# Altium footprint library LukaLIBRARY.PcbLib: 784 footprints (part 13 of 49)
Each footprint in its own frame and in the unit in brackets; x right, y up, seen from the top. Pads: shape width x height; smd on the part's side, far side on the other; paste and mask are expansions set on the pad; w line width, h text height; cw(c..) or ccw(c..) is an arc to the next point about the centre after c.
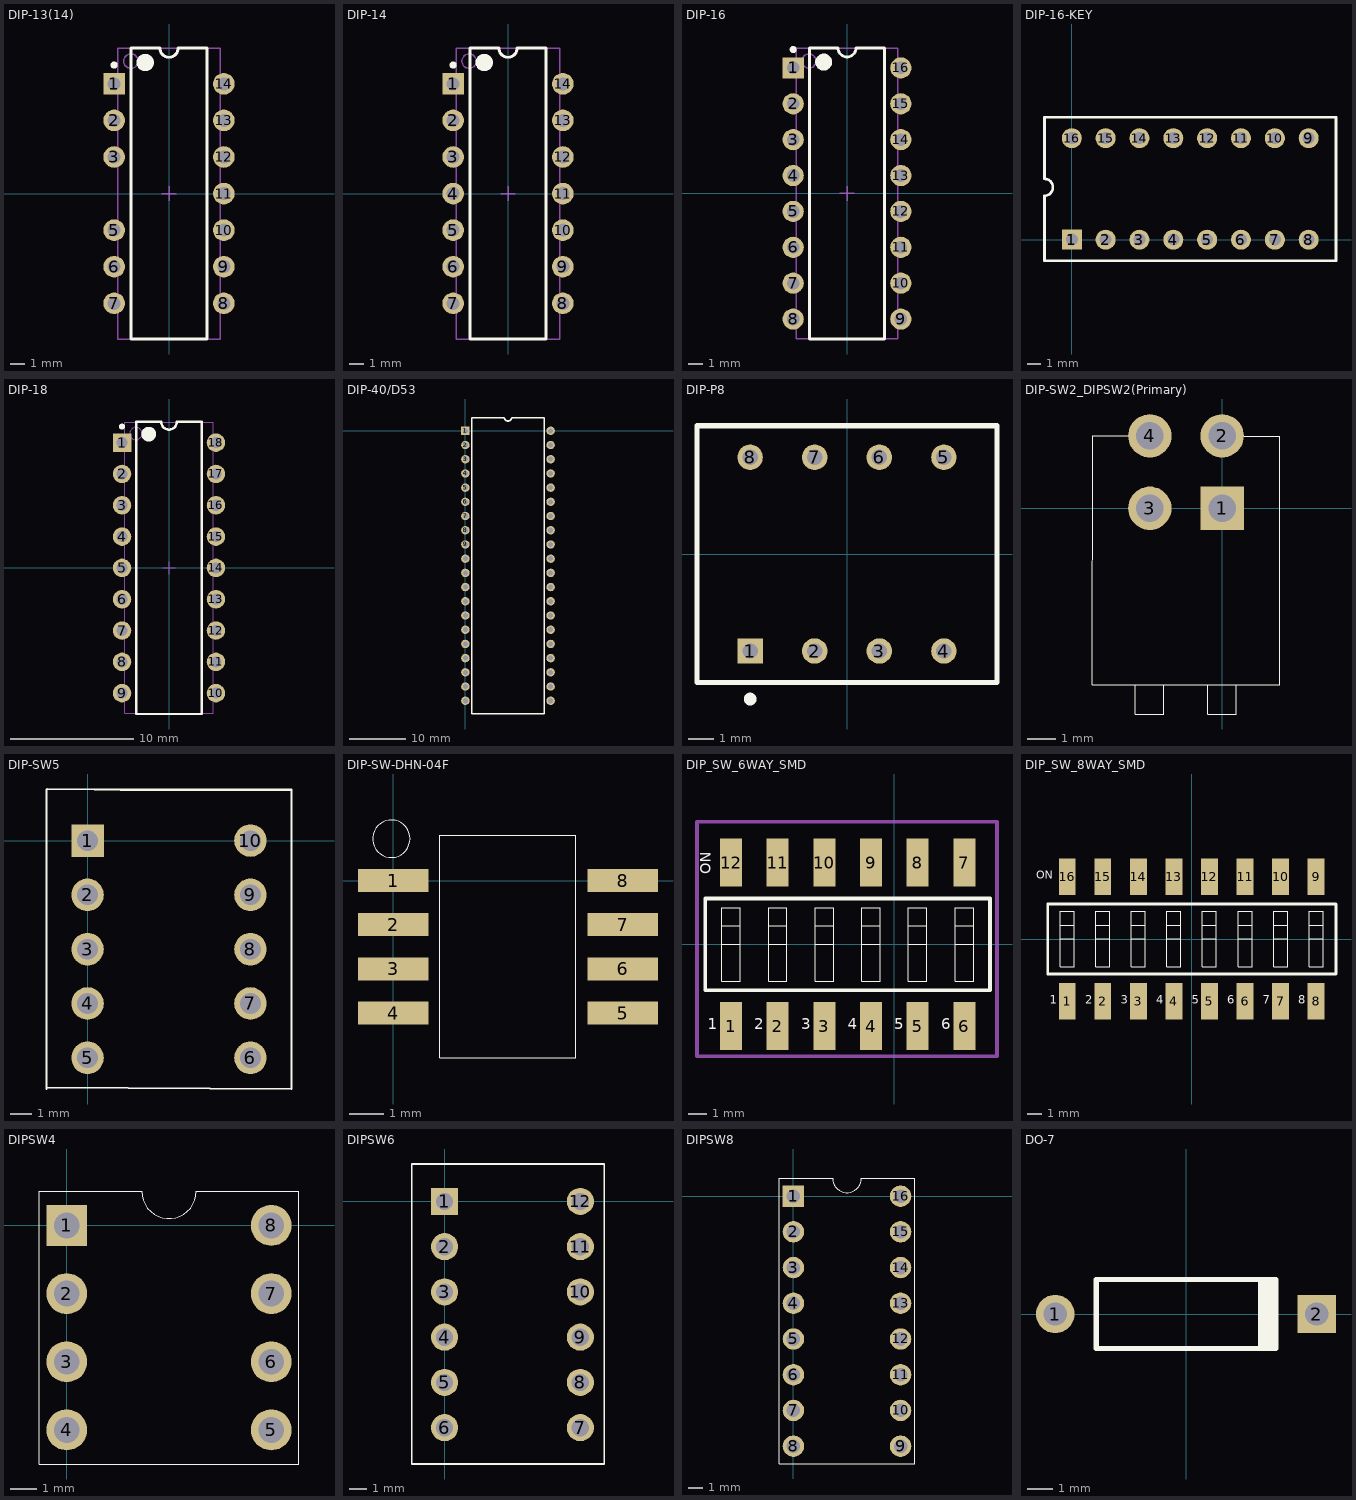
[diagram p12: the footprints below, top view; thin cyan lines are the x and y axes]

## DIP-13(14) [mm] "DIP; 14 Leads (1 Absent); Row Spacing 7.62 mm; Pitch 2.54 mm"
height 5.33
pads (13):
  rect 1.5x1.5 hole 0.9: 1(-3.81,7.62)
  round 1.5 hole 0.9: 2(-3.81,5.08) 3(-3.81,2.54) 5(-3.81,-2.54) 6(-3.81,-5.08) 7(-3.81,-7.62) 8(3.81,-7.62) 9(3.81,-5.08) 10(3.81,-2.54) 11(3.81,0) 12(3.81,2.54) 13(3.81,5.08) 14(3.81,7.62)
Top Overlay:
  circle w0.25: c-3.81,8.92 r0.125
  circle w0.6: c-1.65,9.1 r0.3
  lines w0.2: -2.65,-10.1 -2.65,10.1 -0.635,10.1 ccw(c0,10.1) 0.635,10.1 2.65,10.1 2.65,-10.1 -2.65,-10.1
Mechanical 13:
  circle w0.1: c-2.65,9.2 r0.5
  lines w0.1: -3.55,-10.1 -3.55,10.1 3.55,10.1 3.55,-10.1 -3.55,-10.1
Mechanical 15:
  lines w0.1: -0.5,0 0.5,0 ; 0,-0.5 0,0.5
3D body: height 5.33, standoff 0, extent -3.55,-10.1 3.55,10.1

## DIP-14 [mm] "DIP; 14 Leads; Row Spacing 7.62 mm; Pitch 2.54 mm"
height 5.08
pads (14):
  rect 1.5x1.5 hole 0.9: 1(-3.81,7.62)
  round 1.5 hole 0.9: 2(-3.81,5.08) 3(-3.81,2.54) 4(-3.81,0) 5(-3.81,-2.54) 6(-3.81,-5.08) 7(-3.81,-7.62) 8(3.81,-7.62) 9(3.81,-5.08) 10(3.81,-2.54) 11(3.81,0) 12(3.81,2.54) 13(3.81,5.08) 14(3.81,7.62)
Top Overlay:
  circle w0.6: c-1.65,9.1 r0.3
  circle w0.25: c-3.81,8.92 r0.125
  lines w0.2: -2.65,-10.1 2.65,-10.1 2.65,10.1 0.635,10.1 cw(c0,10.1) -0.635,10.1 -2.65,10.1 -2.65,-10.1
Mechanical 13:
  circle w0.1: c-2.7,9.2 r0.5
  lines w0.1: -3.6,-10.1 3.6,-10.1 3.6,10.1 -3.6,10.1 -3.6,-10.1
Mechanical 15:
  lines w0.1: -0.5,0 0.5,0 ; 0,-0.5 0,0.5
3D body: height 5.08, standoff 0, extent -3.6,-10.1 3.6,10.1

## DIP-16 [mm] "DIP; 16 Leads; Row Spacing 7.62 mm; Pitch 2.54 mm"
height 5.08
pads (16):
  rect 1.5x1.5 hole 0.9: 1(-3.81,8.89)
  round 1.5 hole 0.9: 2(-3.81,6.35) 3(-3.81,3.81) 4(-3.81,1.27) 5(-3.81,-1.27) 6(-3.81,-3.81) 7(-3.81,-6.35) 8(-3.81,-8.89) 9(3.81,-8.89) 10(3.81,-6.35) 11(3.81,-3.81) 12(3.81,-1.27) 13(3.81,1.27) 14(3.81,3.81) 15(3.81,6.35) 16(3.81,8.89)
Top Overlay:
  circle w0.25: c-3.81,10.19 r0.125
  circle w0.6: c-1.65,9.3 r0.3
  lines w0.2: -2.65,-10.3 -2.65,10.3 -0.635,10.3 ccw(c0,10.3) 0.635,10.3 2.65,10.3 2.65,-10.3 -2.65,-10.3
Mechanical 13:
  circle w0.1: c-2.7,9.375 r0.5
  lines w0.1: -3.6,-10.275 -3.6,10.275 3.6,10.275 3.6,-10.275 -3.6,-10.275
Mechanical 15:
  lines w0.1: -0.5,0 0.5,0 ; 0,-0.5 0,0.5
3D body: height 5.08, standoff 0, extent -3.6,-10.275 3.6,10.275

## DIP-16-KEY [mm] "DIP; 16 Leads; Row Spacing 7.62 mm; Pitch 2.54 mm"
pads (16):
  rect 1.5x1.5 hole 0.9: 1(0,0)
  round 1.5 hole 0.9: 2(2.54,0) 3(5.08,0) 4(7.62,0) 5(10.16,0) 6(12.7,0) 7(15.24,0) 8(17.78,0) 9(17.78,7.62) 10(15.24,7.62) 11(12.7,7.62) 12(10.16,7.62) 13(7.62,7.62) 14(5.08,7.62) 15(2.54,7.62) 16(0,7.62)
Top Overlay:
  lines w0.2: -2.05,4.57 cw(c-2.05,3.935) -2.05,3.3 -2.05,-1.59 19.83,-1.59 19.83,9.2 -2.05,9.2 -2.05,4.6

## DIP-18 [mm] "DIP; 18 Leads; Row Spacing 7.62 mm; Pitch 2.54 mm"
height 5.08
pads (18):
  rect 1.5x1.5 hole 0.9: 1(-3.81,10.16)
  round 1.5 hole 0.9: 2(-3.81,7.62) 3(-3.81,5.08) 4(-3.81,2.54) 5(-3.81,0) 6(-3.81,-2.54) 7(-3.81,-5.08) 8(-3.81,-7.62) 9(-3.81,-10.16) 10(3.81,-10.16) 11(3.81,-7.62) 12(3.81,-5.08) 13(3.81,-2.54) 14(3.81,0) 15(3.81,2.54) 16(3.81,5.08) 17(3.81,7.62) 18(3.81,10.16)
Top Overlay:
  circle w0.6: c-1.65,10.85 r0.3
  circle w0.25: c-3.81,11.46 r0.125
  lines w0.2: -2.65,-11.85 2.65,-11.85 2.65,11.85 0.635,11.85 cw(c0,11.85) -0.635,11.85 -2.65,11.85 -2.65,-11.85
Mechanical 13:
  circle w0.1: c-2.7,10.9 r0.5
  lines w0.1: -3.6,-11.8 3.6,-11.8 3.6,11.8 -3.6,11.8 -3.6,-11.8
Mechanical 15:
  lines w0.1: -0.5,0 0.5,0 ; 0,-0.5 0,0.5
3D body: height 5.08, standoff 0, extent -3.6,-11.8 3.6,11.8

## DIP-40/D53 [mm]
pads (40):
  rect 1.5x1.5 hole 0.9: 1(0,0)
  round 1.5 hole 0.9: 2(0,-2.54) 3(0,-5.08) 4(0,-7.62) 5(0,-10.16) 6(0,-12.7) 7(0,-15.24) 8(0,-17.78) 9(0,-20.32) 10(0,-22.86) 11(0,-25.4) 12(0,-27.94) 13(0,-30.48) 14(0,-33.02) 15(0,-35.56) 16(0,-38.1) 17(0,-40.64) 18(0,-43.18) 19(0,-45.72) 20(0,-48.26) 21(15.24,-48.26) 22(15.24,-45.72) 23(15.24,-43.18) 24(15.24,-40.64) 25(15.24,-38.1) 26(15.24,-35.56) 27(15.24,-33.02) 28(15.24,-30.48) 29(15.24,-27.94) 30(15.24,-25.4) 31(15.24,-22.86) 32(15.24,-20.32) 33(15.24,-17.78) 34(15.24,-15.24) 35(15.24,-12.7) 36(15.24,-10.16) 37(15.24,-7.62) 38(15.24,-5.08) 39(15.24,-2.54) 40(15.24,0)
Top Overlay:
  lines w0.25: 1.17,-50.63 14.07,-50.63 14.07,2.37 8.255,2.37 cw(c7.62,2.37) 6.985,2.37 1.17,2.37 1.17,-50.63

## DIP-P8 [mm] "Dual-Pole Dual-Throw Relay; 8 Leads"
pads (8):
  rect 1x1 hole 0.6: 1(-3.81,-3.81)
  round 1 hole 0.6: 2(-1.27,-3.81) 3(1.27,-3.81) 4(3.81,-3.81) 5(3.81,3.81) 6(1.27,3.81) 7(-1.27,3.81) 8(-3.81,3.81)
Top Overlay:
  circle w0.25: c-3.81,-5.7 r0.125
  lines w0.2: -5.9,-5.05 -5.9,-0.635 -5.9,5.05 5.9,5.05 5.9,-5.05 -5.9,-5.05

## DIP-SW2_DIPSW2(Primary) [mil]
pads (4):
  rect 60x60 hole 38 mask-1000: 1(0,0)
  round 60 hole 38 mask-1000: 2(0,100) 3(-100,0) 4(-100,100)
Top Overlay:
  lines w1.18: -129.92,100 -179.13,100 -179.53,-244.09 79.53,-244.09 79.53,99.61 29.92,99.61 ; -120.08,-244.49 -120.08,-284.25 -80.71,-284.25 -80.71,-244.09 -100.39,-244.09 ; -19.68,-244.49 -19.68,-284.25 19.68,-284.25 19.68,-244.09 0,-244.09
Top Solder:
  region: -100,-30.26 -92.17,-29.23 -84.87,-26.2 -78.6,-21.4 -73.8,-15.13 -70.77,-7.83 -69.74,0 -70.77,7.83 -73.8,15.13 -78.6,21.4 -84.87,26.2 -92.17,29.23 -100,30.26 -107.83,29.23 -115.13,26.2 -121.4,21.4 -126.2,15.13 -129.23,7.83 -130.26,0 -129.23,-7.83 -126.2,-15.13 -121.4,-21.4 -115.13,-26.2 -107.83,-29.23
  region: -100,69.74 -92.17,70.77 -84.87,73.8 -78.6,78.6 -73.8,84.87 -70.77,92.17 -69.74,100 -70.77,107.83 -73.8,115.13 -78.6,121.4 -84.87,126.2 -92.17,129.23 -100,130.26 -107.83,129.23 -115.13,126.2 -121.4,121.4 -126.2,115.13 -129.23,107.83 -130.26,100 -129.23,92.17 -126.2,84.87 -121.4,78.6 -115.13,73.8 -107.83,70.77
  region: 30,30 -30,30 -30,-30 30,-30
  region: 0,69.74 7.83,70.77 15.13,73.8 21.4,78.6 26.2,84.87 29.23,92.17 30.26,100 29.23,107.83 26.2,115.13 21.4,121.4 15.13,126.2 7.83,129.23 0,130.26 -7.83,129.23 -15.13,126.2 -21.4,121.4 -26.2,115.13 -29.23,107.83 -30.26,100 -29.23,92.17 -26.2,84.87 -21.4,78.6 -15.13,73.8 -7.83,70.77
Bottom Solder:
  region: -100,-30.26 -92.17,-29.23 -84.87,-26.2 -78.6,-21.4 -73.8,-15.13 -70.77,-7.83 -69.74,0 -70.77,7.83 -73.8,15.13 -78.6,21.4 -84.87,26.2 -92.17,29.23 -100,30.26 -107.83,29.23 -115.13,26.2 -121.4,21.4 -126.2,15.13 -129.23,7.83 -130.26,0 -129.23,-7.83 -126.2,-15.13 -121.4,-21.4 -115.13,-26.2 -107.83,-29.23
  region: -100,69.74 -92.17,70.77 -84.87,73.8 -78.6,78.6 -73.8,84.87 -70.77,92.17 -69.74,100 -70.77,107.83 -73.8,115.13 -78.6,121.4 -84.87,126.2 -92.17,129.23 -100,130.26 -107.83,129.23 -115.13,126.2 -121.4,121.4 -126.2,115.13 -129.23,107.83 -130.26,100 -129.23,92.17 -126.2,84.87 -121.4,78.6 -115.13,73.8 -107.83,70.77
  region: 30,30 -30,30 -30,-30 30,-30
  region: 0,69.74 7.83,70.77 15.13,73.8 21.4,78.6 26.2,84.87 29.23,92.17 30.26,100 29.23,107.83 26.2,115.13 21.4,121.4 15.13,126.2 7.83,129.23 0,130.26 -7.83,129.23 -15.13,126.2 -21.4,121.4 -26.2,115.13 -29.23,107.83 -30.26,100 -29.23,92.17 -26.2,84.87 -21.4,78.6 -15.13,73.8 -7.83,70.77

## DIP-SW5 [mil]
pads (10):
  rect 60x60 hole 38 mask-1000: 1(0,0)
  round 60 hole 38 mask-1000: 2(0,-100) 3(0,-200) 4(0,-300) 5(0,-400) 6(300,-400) 7(300,-300) 8(300,-200) 9(300,-100) 10(300,0)
Top Overlay:
  lines w3.94: -75.59,-457.48 -75.59,93.7 ; -75,-455 375.59,-457.48 375.59,93.7 218.11,93.7 60.63,93.7 ; -75,95 100,93.7
Top Solder:
  drawing of 10 lines, arcs and shapes, not listed
Bottom Solder:
  drawing of 10 lines, arcs and shapes, not listed

## DIP-SW-DHN-04F [mil]
pads (8):
  rect 80x26 smd mask-1000: 1(0,0) 2(0,-50) 3(0,-100) 4(0,-150) 5(259.37,-150) 6(259.37,-100) 7(259.37,-50) 8(259.37,0)
Top Overlay:
  circle w1.18: c-2.36,47.24 r21.2
  lines w1: 52.76,-200.79 206.3,-200.79 206.3,51.18 52.76,51.18 52.76,-200.79
Top Solder:
  region: 219.37,-13 299.37,-13 299.37,13 219.37,13
  region: -40,-13 40,-13 40,13 -40,13
  region: 219.37,-63 299.37,-63 299.37,-37 219.37,-37
  region: 219.37,-113 299.37,-113 299.37,-87 219.37,-87
  region: 219.37,-163 299.37,-163 299.37,-137 219.37,-137
  region: -40,-113 40,-113 40,-87 -40,-87
  region: -40,-63 40,-63 40,-37 -40,-37
  region: -40,-163 40,-163 40,-137 -40,-137

## DIP_SW_6WAY_SMD [mm] "DIP Switch; 12 Leads"
height 5.06
pads (12):
  rect 1.2x2.6 smd: 1(-8.89,-4.45) 2(-6.35,-4.45) 3(-3.81,-4.45) 4(-1.27,-4.45) 5(1.27,-4.45) 6(3.81,-4.45) 7(3.81,4.45) 8(1.27,4.45) 9(-1.27,4.45) 10(-3.81,4.45) 11(-6.35,4.45) 12(-8.89,4.45)
Top Overlay:
  lines w0.025: -9.39,0 -8.39,0 ; -9.39,1 -8.39,1 ; -6.85,0 -5.85,0 ; -6.85,1 -5.85,1 ; -4.31,0 -3.31,0 ; -4.31,1 -3.31,1 ; -1.77,0 -0.77,0 ; -1.77,1 -0.77,1 ; 0.77,0 1.77,0 ; 0.77,1 1.77,1 ; 3.31,0 4.31,0 ; 3.31,1 4.31,1 ; -9.39,-2 -9.39,2 -8.39,2 -8.39,-2 -9.39,-2 ; -6.85,-2 -6.85,2 -5.85,2 -5.85,-2 -6.85,-2 ; -4.31,-2 -4.31,2 -3.31,2 -3.31,-2 -4.31,-2 ; -1.77,-2 -1.77,2 -0.77,2 -0.77,-2 -1.77,-2 ; 0.77,-2 0.77,2 1.77,2 1.77,-2 0.77,-2 ; 3.31,-2 3.31,2 4.31,2 4.31,-2 3.31,-2
  lines w0.2: -10.29,-2.5 -10.29,2.5 5.207,2.5 5.207,-2.5 -10.29,-2.5
  text "1" at -10.16,-4.826 h1.02
  text "ON" at -9.804,3.81 h1
  text "2" at -7.62,-4.826 h1.02
  text "3" at -5.08,-4.826 h1.02
  text "4" at -2.54,-4.826 h1.02
  text "5" at 0,-4.826 h1.02
  text "6" at 2.54,-4.826 h1.02
Mechanical 15:
  lines w0.2: -10.744,-6.096 -10.744,6.68 5.588,6.68 5.588,-6.096 -10.744,-6.096

## DIP_SW_8WAY_SMD [mm] "DIP Switch; 16 Leads"
height 5.06
pads (16):
  rect 1.2x2.6 smd: 1(-8.89,-4.45) 2(-6.35,-4.45) 3(-3.81,-4.45) 4(-1.27,-4.45) 5(1.27,-4.45) 6(3.81,-4.45) 7(6.35,-4.45) 8(8.89,-4.45) 9(8.89,4.45) 10(6.35,4.45) 11(3.81,4.45) 12(1.27,4.45) 13(-1.27,4.45) 14(-3.81,4.45) 15(-6.35,4.45) 16(-8.89,4.45)
Top Overlay:
  lines w0.025: -9.39,0 -8.39,0 ; -9.39,1 -8.39,1 ; -6.85,0 -5.85,0 ; -6.85,1 -5.85,1 ; -4.31,0 -3.31,0 ; -4.31,1 -3.31,1 ; -1.77,0 -0.77,0 ; -1.77,1 -0.77,1 ; 0.77,0 1.77,0 ; 0.77,1 1.77,1 ; 3.31,0 4.31,0 ; 3.31,1 4.31,1 ; 5.85,0 6.85,0 ; 5.85,1 6.85,1 ; 8.39,0 9.39,0 ; 8.39,1 9.39,1 ; -9.39,-2 -8.39,-2 -8.39,2 -9.39,2 -9.39,-2 ; -6.85,-2 -5.85,-2 -5.85,2 -6.85,2 -6.85,-2 ; -4.31,-2 -3.31,-2 -3.31,2 -4.31,2 -4.31,-2 ; -1.77,-2 -0.77,-2 -0.77,2 -1.77,2 -1.77,-2 ; 0.77,-2 1.77,-2 1.77,2 0.77,2 0.77,-2 ; 3.31,-2 4.31,-2 4.31,2 3.31,2 3.31,-2 ; 5.85,-2 6.85,-2 6.85,2 5.85,2 5.85,-2 ; 8.39,-2 9.39,-2 9.39,2 8.39,2 8.39,-2
  lines w0.2: -10.29,-2.5 10.31,-2.5 10.31,2.5 -10.29,2.5 -10.29,-2.5
  text "ON" at -11.125,4.089 h1
  text "1" at -10.16,-4.826 h1.02
  text "2" at -7.62,-4.826 h1.02
  text "3" at -5.08,-4.826 h1.02
  text "4" at -2.54,-4.826 h1.02
  text "5" at 0,-4.826 h1.02
  text "6" at 2.54,-4.826 h1.02
  text "8" at 7.62,-4.826 h1.02
  text "7" at 5.08,-4.826 h1.02

## DIPSW4 [mil]
pads (8):
  rect 60x60 hole 38 mask-1000: 1(0,0)
  round 60 hole 38 mask-1000: 2(0,-100) 3(0,-200) 4(0,-300) 5(300,-300) 6(300,-200) 7(300,-100) 8(300,0)
Top Overlay:
  lines w1: -40,-350 340,-350 340,50 190,50 cw(c150,50) 110,50 -40,50 -40,-350
Top Solder:
  drawing of 8 lines, arcs and shapes, not listed
Bottom Solder:
  drawing of 8 lines, arcs and shapes, not listed

## DIPSW6 [mil]
pads (12):
  rect 60x60 hole 38 mask-1000: 1(0,-0.79)
  round 60 hole 38 mask-1000: 2(0,-100.79) 3(0,-200.79) 4(0,-300.79) 5(0,-400.79) 6(0,-500.79) 7(300,-500.79) 8(300,-400.79) 9(300,-300.79) 10(300,-200.79) 11(300,-100.79) 12(300,-0.79)
Top Overlay:
  lines w3.94: -72.44,-581.1 -72.44,81.89 352.76,81.89 352.76,-581.1 -72.44,-581.1
Top Solder:
  drawing of 12 lines, arcs and shapes, not listed
Bottom Solder:
  drawing of 12 lines, arcs and shapes, not listed

## DIPSW8 [mil]
pads (16):
  rect 60x60 hole 38 mask-1000: 1(0,0)
  round 60 hole 38 mask-1000: 2(0,-100) 3(0,-200) 4(0,-300) 5(0,-400) 6(0,-500) 7(0,-600) 8(0,-700) 9(300,-700) 10(300,-600) 11(300,-500) 12(300,-400) 13(300,-300) 14(300,-200) 15(300,-100) 16(300,0)
Top Overlay:
  lines w1: -40,-750 -40,50 110,50 ccw(c150,50) 190,50 340,50 340,-750 -40,-750
Top Solder:
  drawing of 16 lines, arcs and shapes, not listed
Bottom Solder:
  drawing of 16 lines, arcs and shapes, not listed

## DO-7 [mm] "Diode, Axial; Body 7 x 2.7 mm (LxDia. max), Lead Dia. 0.53 mm (max)"
height 2.7
pads (2):
  round 1.5 hole 0.9: 1(-5.1,0)
  rect 1.5x1.5 hole 0.9: 2(5.1,0)
Top Overlay:
  rectangle: 2.8,-1.35 3.6,1.35
  lines w0.2: 3.5,-1.35 -3.5,-1.35 -3.5,1.35 3.5,1.35